# Altium footprint library Connectors.PcbLib: 135 footprints (part 4 of 9)
Each footprint in its own frame and in the unit in brackets; x right, y up, seen from the top. Pads: shape width x height; smd on the part's side, far side on the other; paste and mask are expansions set on the pad; w line width, h text height; cw(c..) or ccw(c..) is an arc to the next point about the centre after c.
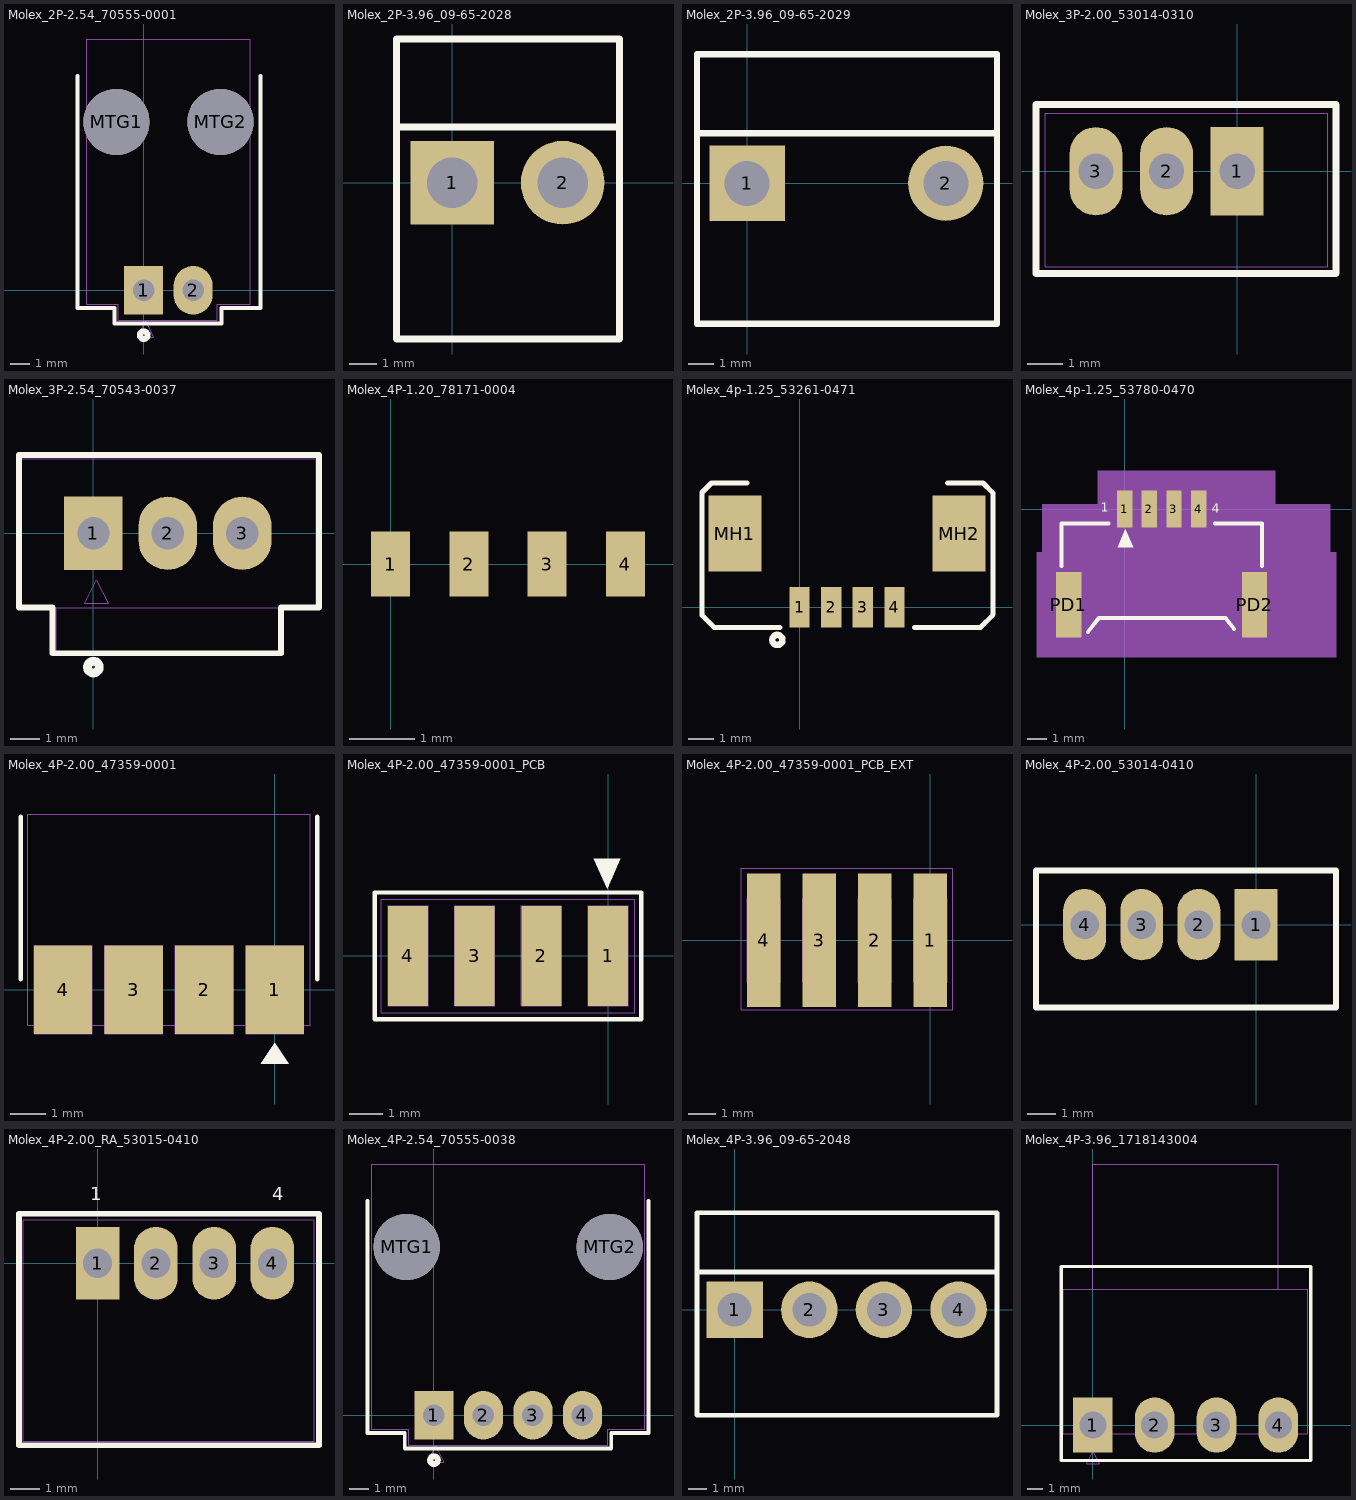
[diagram p3: the footprints below, top view; thin cyan lines are the x and y axes]

## Molex_2P-2.54_70555-0001 [mm] "Connector Header 2pos 2.54mmp right angle through hole"
height 6
pads (4):
  rect 2x2.5 hole 1.1: 1(0,0)
  oval 2x2.5 hole 1.1: 2(2.54,0)
  round 3.4 hole 3.4 unplated: MTG1(-1.4,8.64) MTG2(3.94,8.64)
Top Overlay:
  circle w0.3: c0,-2.3 r0.2
  lines w0.2: -3.4,11 -3.4,-0.9 -1.5,-0.9 -1.5,-1.7 4,-1.7 4,-0.9 6,-0.9 6,11
Mechanical 1:
  circle w0.025: c0,0 r0.52
  circle w0.025: c2.54,0 r0.52
  lines w0.025: -2.93,-0.705 -2.93,12.895 5.47,12.895 5.47,-0.705 3.77,-0.705 3.77,-1.53 -1.305,-1.53 -1.305,-0.705 -2.93,-0.705 ; -0.3,-2.4 0.1,-1.6 0.5,-2.4 -0.3,-2.4
  text ".Designator" at -0.98,5.57 h1.52
3D body "705550001.stp": height 6.98, standoff -3.3, extent -2.921,-0.698 5.461,12.891

## Molex_2P-3.96_09-65-2028 [mm] "Connector Header 2pos 3.96mmp vertical through hole"
height 6
pads (2):
  rect 3x3 hole 1.8 paste-3: 1(0,0)
  round 3 hole 1.8 paste-3: 2(3.96,0)
Top Overlay:
  lines w0.254: -2,2 6,2 ; -2,-5.6 -2,5.15 6,5.15 6,-5.6 -2,-5.6
Mechanical 1:
  text ".Designator" at -1.3,5.7 h1.52
3D body "009652028.stp": height 13.85, standoff -3.6, extent -1.6,-5.6 5.56,5.15

## Molex_2P-3.96_09-65-2029 [mm] "Connector Header 2pos 3.96mmp vertical through hole missing pin"
height 6
pads (2):
  rect 3x3 hole 1.8 paste-3: 1(0,0)
  round 3 hole 1.8 paste-3: 2(7.92,0)
Top Overlay:
  lines w0.254: -2,2 9.96,2 ; 9.9,-5.6 -2,-5.6 -2,5.15 9.9,5.15 ; 9.96,-5.6 9.96,5.15
Mechanical 1:
  text ".Designator" at -1.3,5.7 h1.52
3D body "009652029.stp": height 13.85, standoff -3.6, extent -1.56,-5.6 9.56,5.15

## Molex_3P-2.00_53014-0310 [mm] "Connector Header 3pos 2mmp Vertical through hole"
height 6
pads (3):
  rect 1.5x2.5 hole 1: 1(0,0)
  oval 1.5x2.5 hole 1: 2(-2,0) 3(-4,0)
Top Overlay:
  lines w0.2: -5.7,-2.9 2.8,-2.9 2.8,1.9 -5.7,1.9 -5.7,-2.9
Mechanical 1:
  lines w0.025: -5.44,-2.7 -5.44,1.65 2.56,1.65 2.56,-2.7 -5.44,-2.7
  text ".Designator" at -3.7,-2.4 h1
3D body "530140310.stp": height 5.85, standoff -3.5, extent -5.44,-2.7 2.56,1.65

## Molex_3P-2.54_70543-0037 [mm] "Connector Header 3pos 2.54mmp vertical through hole"
height 6
pads (3):
  rect 2x2.5 hole 1.1: 1(0,0)
  oval 2x2.5 hole 1.1: 2(2.54,0) 3(5.08,0)
Top Overlay:
  circle w0.3: c0,-4.572 r0.2
  lines w0.2: -2.54,2.667 -2.54,-2.54 -1.4,-2.54 -1.4,-4.1 6.4,-4.1 6.4,-2.54 7.7,-2.54 7.7,2.667
  lines w0.203: -2.54,2.667 7.7,2.667
Mechanical 1:
  circle w0.025: c2.54,0 r0.52
  circle w0.025: c0,0 r0.52
  lines w0.025: -1.305,-2.54 6.35,-2.54 ; 6.35,-2.54 6.35,-4.064 -1.275,-4.064 -1.275,-2.54 -2.525,-2.54 -2.525,2.54 7.6,2.54 7.6,-2.54 6.35,-2.54 ; -0.3,-2.4 0.5,-2.4 0.1,-1.6 -0.3,-2.4
  text ".Designator" at -0.381,3.175 h1.52
Mechanical 13:
  circle w0.025: c0,0 r0.551
  circle w0.025: c2.54,0 r0.551
  circle w0.025: c5.08,0 r0.551
3D body "705430037.stp": height 11.81, standoff -3.3, extent -2.54,-4.064 7.62,2.54

## Molex_4P-1.20_78171-0004 [mm] "Connector Header 4pos 1.2mmp RA smt"
height 1.55
pads (4):
  rect 0.6x1 smd: 1(0,0) 2(1.2,0) 3(2.4,0) 4(3.6,0)

## Molex_4p-1.25_53261-0471 [mm] "Connector, PicoBlade header, surface mount, RA, 4 circuits, 1.25mm pitch"
height 3.4
pads (6):
  rect 0.8x1.6 smd: 1(0,0) 2(1.25,0) 3(2.5,0) 4(3.75,0)
  rect 2.1x3 smd: MH1(-2.55,2.9) MH2(6.3,2.9)
Top Overlay:
  circle w0.254: c-0.875,-1.3 r0.2
  lines w0.2: -2.075,4.9 -3.475,4.9 -3.85,4.525 -3.85,-0.325 -3.375,-0.8 -0.775,-0.8 ; 4.55,-0.8 7.15,-0.8 7.65,-0.3 7.65,4.5 7.25,4.9 5.85,4.9
Mechanical 1:
  lines w0.025: -2.1,4.9 -3.475,4.9 -3.85,4.525 -3.85,-0.325 -3.375,-0.8 -0.775,-0.8 ; 4.55,-0.8 7.15,-0.8 7.65,-0.3 7.65,4.5 7.25,4.9 5.85,4.9
  text "4" at 3.6,1.1 h1.27
  text "1" at -0.3,1.1 h1.27
3D body "532610471.stp": height 3.4, standoff 0, extent -3.2,-0.4 6.95,4.8

## Molex_4p-1.25_53780-0470 [mm] "Molex Panelmate Connector 4p 1.25mm pitch"
height 1.854
pads (6):
  rect 0.787x1.905 smd: 1(0,0) 2(1.25,0) 3(2.5,0) 4(3.75,0)
  rect 1.3x3.35 smd: PD1(-2.85,-4.875)
  rect 1.295x3.353 smd: PD2(6.6,-4.875)
Top Overlay:
  region: -0.375,-1.938 0.425,-1.938 0.025,-1.038
  lines w0.203: -3.225,-2.9 -3.225,-0.75 -0.825,-0.75 ; -1.875,-6.25 -1.325,-5.55 5.125,-5.55 5.556,-6.099 ; 4.575,-0.75 6.975,-0.75 6.975,-2.9
  text "1" at -1.24,-0.3 h0.79
  text "4" at 4.425,-0.337 h0.79
Mechanical 1:
  lines w0.025: -3.2,-3.6 -2.225,-3.6 -2.225,-4 -2.425,-4 -2.425,-6.25 -2.405,-6.25 ; -3.2,-3.5 -2.225,-3.5 -2.225,-2.25 -1.975,-2.25 -1.975,-5.95 -2.225,-5.95 -2.225,-4.1 -2.325,-4.1 -2.325,-6.25 ; -0.2,-0.75 -0.2,0.25 0.2,0.25 0.2,-0.75 ; -0.2,-0.15 0.2,-0.15 ; 1.05,-0.75 1.05,0.25 1.45,0.25 1.45,-0.75 ; 1.05,-0.15 1.45,-0.15 ; 2.3,-0.75 2.3,0.25 2.7,0.25 2.7,-0.75 ; 2.3,-0.15 2.7,-0.15 ; 3.55,-0.75 3.55,0.25 3.95,0.25 3.95,-0.75 ; 3.55,-0.15 3.95,-0.15 ; 5.8,-6.25 6.21,-6.25 6.39,-6.25 6.45,-6.25 7,-6.25 ; 6.125,-6.25 6.125,-4.1 6.025,-4.1 6.025,-5.95 5.775,-5.95 5.775,-2.25 6.025,-2.25 6.025,-3.5 7,-3.5 ; 6.205,-6.25 6.225,-6.25 6.225,-4 6.025,-4 6.025,-3.6 7,-3.6 ; 7,-6.25 5.662,-6.25 5.138,-5.55 -1.325,-5.55 -1.85,-6.25 -2,-6.25 -2.41,-6.25 -2.59,-6.25 -2.65,-6.25 -3.2,-6.25 -3.2,-5.39 -3.2,-5.34 -3.2,-0.75 7,-0.75 7,-5.34 7,-5.39 7,-6.25 ; -0.425,-1.55 -0.025,-0.75 0.375,-1.55 -0.425,-1.55
  text "1" at -1.275,-0.337 h0.79
  text "4" at 4.425,-0.337 h0.79
  text ".Designator" at 1,-6.5 h0.79
Mechanical 11:
  pour cut-out: -3.2,-0.75 -0.394,-0.75 -0.394,0.953 6.644,0.953 6.644,-0.75 9.45,-0.75 9.45,-3.198 9.748,-3.198 9.748,-6.552 -3.498,-6.552 -3.498,-3.198 -3.2,-3.198
Mechanical 13:
  pour cut-out: -4.2,-2.198 -4.2,0.25 -1.394,0.25 -1.394,1.953 7.644,1.953 7.644,0.25 10.45,0.25 10.45,-2.198 10.748,-2.198 10.748,-7.552 -4.498,-7.552 -4.498,-2.198
3D body "537800470.stp": height 1.9, standoff 0, extent -3.175,-6.25 6.975,0.25

## Molex_4P-2.00_47359-0001 [mm] "Connector Battery 4pos 2mmp SMT"
height 3.1
pads (4):
  rect 1.65x2.5 smd: 1(0,0) 2(-2,0) 3(-4,0) 4(-6,0)
Top Overlay:
  region: -0.4,-2.1 0.4,-2.1 0,-1.5
  lines w0.127: -7.2,0.3 -7.2,4.9 ; 1.2,0.3 1.2,4.9
Mechanical 1:
  lines w0.025: -7,-1 1,-1 1,4.98 -7,4.98 -7,-1 ; -6.825,-1.25 -5.175,-1.25 -5.175,1.25 -6.825,1.25 -6.825,-1.25 ; -4.825,-1.25 -4.825,1.25 -3.175,1.25 -3.175,-1.25 -4.825,-1.25 ; -2.825,-1.25 -2.825,1.25 -1.175,1.25 -1.175,-1.25 -2.825,-1.25 ; -0.825,-1.25 -0.825,1.25 0.825,1.25 0.825,-1.25 -0.825,-1.25
  text "4" at -6.375,-2.5 h1
  text "1" at -0.25,-2.5 h1
  text ".Designator" at -4,2.175 h1.52
3D body "473590001.stp": height 2.09, standoff 0, extent -7,-1 1,4.98

## Molex_4P-2.00_47359-0001_PCB [mm] "Connector Battery 4pos 2mmp PCB"
pads (4):
  rect 1.2x3 smd: 1(0,0) 2(-2,0) 3(-4,0) 4(-6,0)
Top Overlay:
  region: 0.371,2.914 -0.429,2.914 -0.029,2.014
  lines w0.127: -7,-1.9 1,-1.9 1,1.9 -7,1.9 -7,-1.9
Mechanical 1:
  lines w0.025: -6.8,-1.7 0.8,-1.7 0.8,1.7 -6.8,1.7 -6.8,-1.7 ; -6.6,-1.5 -5.4,-1.5 -5.4,1.5 -6.6,1.5 -6.6,-1.5 ; -4.6,-1.5 -4.6,1.5 -3.4,1.5 -3.4,-1.5 -4.6,-1.5 ; -2.6,-1.5 -2.6,1.5 -1.4,1.5 -1.4,-1.5 -2.6,-1.5 ; -0.6,-1.5 -0.6,1.5 0.6,1.5 0.6,-1.5 -0.6,-1.5
  text "1" at -0.1,-2.8 h1
  text "4" at -6.3,-2.775 h1
  text ".Designator" at -4.425,2.1 h1.52

## Molex_4P-2.00_47359-0001_PCB_EXT [mm] "Connector Battery 4pos 2mmp PCB w/Extended Pads"
pads (4):
  rect 1.2x4.8 smd: 1(0,0) 2(-2,0) 3(-4,0) 4(-6,0)
Mechanical 1:
  lines w0.025: -6.8,-2.5 0.8,-2.5 0.8,2.6 -6.8,2.6 -6.8,-2.5 ; -6.6,-1.5 -5.4,-1.5 -5.4,1.5 -6.6,1.5 -6.6,-1.5 ; -4.6,-1.5 -4.6,1.5 -3.4,1.5 -3.4,-1.5 -4.6,-1.5 ; -2.6,-1.5 -2.6,1.5 -1.4,1.5 -1.4,-1.5 -2.6,-1.5 ; -0.6,-1.5 -0.6,1.5 0.6,1.5 0.6,-1.5 -0.6,-1.5
  text "1" at -0.1,-3.2 h1
  text "4" at -6.3,-3.2 h1
  text ".Designator" at -5.1,-0.4 h1

## Molex_4P-2.00_53014-0410 [mm] "Connector Header 4pos 2mmp Vertical through hole"
height 6
pads (4):
  rect 1.5x2.5 hole 1: 1(0,0)
  oval 1.5x2.5 hole 1: 2(-2,0) 3(-4,0) 4(-6,0)
Top Overlay:
  lines w0.2: -7.7,-2.9 -7.7,1.9 2.8,1.9 2.8,-2.9 -7.7,-2.9
Mechanical 1:
  text ".Designator" at -5,-2.4 h1
3D body "530140410.stp": height 5.85, standoff -3.5, extent -7.44,-2.7 2.56,1.65

## Molex_4P-2.00_RA_53015-0410 [mm] "Connector Header 4pos 2mmp RA through hole"
height 6
pads (4):
  rect 1.5x2.5 hole 1: 1(0,0)
  oval 1.5x2.5 hole 1: 2(2,0) 3(4,0) 4(6,0)
Top Overlay:
  lines w0.2: -2.7,-6.25 -2.7,1.7 7.6,1.7 7.6,-6.25 -2.7,-6.25
  text "4" at 6,2 h0.76
  text "1" at -0.25,2 h0.76
Mechanical 1:
  lines w0.025: -2.56,-0.161 -2.56,-0.161 -2.56,-6.11 -2.56,-6.11 -0.16,-6.11 ; -2.56,-0.161 -2.56,-0.16 ; -2.56,-0.16 -2.56,-0.16 -2.56,1.49 7.44,1.49 ; -0.16,-6.11 7.44,-6.11 7.44,1.49 ; -0.16,-6.11 -0.16,-6.11 ; 7.44,1.49 7.44,1.49
  text ".Designator" at 1.25,2.25 h1.52
  text "1" at -0.25,-2.5 h1
  text "4" at 5.75,-2.5 h1
3D body "530150410.stp": height 4.65, standoff -3.5, extent -2.56,-6.11 7.44,1.49

## Molex_4P-2.54_70555-0038 [mm] "Connector Header 4pos 2.54mmp right angle through hole"
height 6
pads (6):
  rect 2x2.5 hole 1.1: 1(0,0)
  oval 2x2.5 hole 1.1: 2(2.54,0) 3(5.08,0) 4(7.62,0)
  round 3.4 hole 3.4 unplated: MTG1(-1.4,8.64) MTG2(9.02,8.64)
Top Overlay:
  circle w0.3: c0,-2.3 r0.2
  lines w0.2: -3.4,11 -3.4,-0.9 -1.5,-0.9 -1.5,-1.7 9.1,-1.7 9.1,-0.9 11,-0.9 11,11
Mechanical 1:
  circle w0.025: c2.54,0 r0.52
  circle w0.025: c0,0 r0.52
  lines w0.025: -3.18,-0.705 -1.305,-0.705 -1.305,-1.53 8.92,-1.53 8.92,-0.705 10.82,-0.705 10.82,12.895 -3.18,12.895 -3.18,-0.705 ; -0.3,-2.4 0.5,-2.4 0.1,-1.6 -0.3,-2.4
  text ".Designator" at 1.32,5.5 h1.52
3D body "705550038.stp": height 6.98, standoff -3.3, extent -3.175,-0.698 10.795,12.89

## Molex_4P-3.96_09-65-2048 [mm] "Connector Header 4pos 3.96mmp vertical through hole missing pin"
height 6
pads (4):
  rect 3x3 hole 1.8 paste-3: 1(0,0)
  round 3 hole 1.8 paste-3: 2(3.96,0) 3(7.92,0) 4(11.88,0)
Top Overlay:
  lines w0.254: -2,2 13.92,2 ; 13.9,-5.6 -2,-5.6 -2,5.15 13.92,5.15 13.92,-5.6
Mechanical 1:
  text ".Designator" at 2.3,5.7 h1.52
3D body "009652048.stp": height 13.85, standoff -3.6, extent -1.64,-5.6 13.44,5.15

## Molex_4P-3.96_1718143004 [mil] "Connector Header 4pos 3.96mmp right angle through hole"
height 236.22
pads (4):
  rect 100x140 hole 68: 1(0,0)
  oval 100x140 hole 68: 2(156,0) 3(312,0) 4(468,0)
Top Overlay:
  lines w7.87: -80,-90 -80,400 550,400 550,-90 -80,-90
Mechanical 1:
  circle w1: c0,0 r20.47
  circle w1: c468,0 r20.47
  circle w1: c312,0 r20.47
  circle w1: c0,0 r20.47
  circle w1: c156,0 r20.47
  lines w1: -74.99,-21.99 -74.99,343 543.01,343 543.01,-21.99 -74.99,-21.99 ; -15.75,-98.43 0,-66.93 15.75,-98.43 -15.75,-98.43
  text ".Designator" at 51.97,216.53 h60
Mechanical 13:
  lines w1: -75,343 0,343 0,659 468,659 468,343 543,343
3D body "1718143004.stp": height 394, standoff -100, extent -74.99,-21.99 543.01,789.01